# Altium footprint library sun_library.PcbLib: 412 footprints (part 6 of 26)
Each footprint in its own frame and in the unit in brackets; x right, y up, seen from the top. Pads: shape width x height; smd on the part's side, far side on the other; paste and mask are expansions set on the pad; w line width, h text height; cw(c..) or ccw(c..) is an arc to the next point about the centre after c.
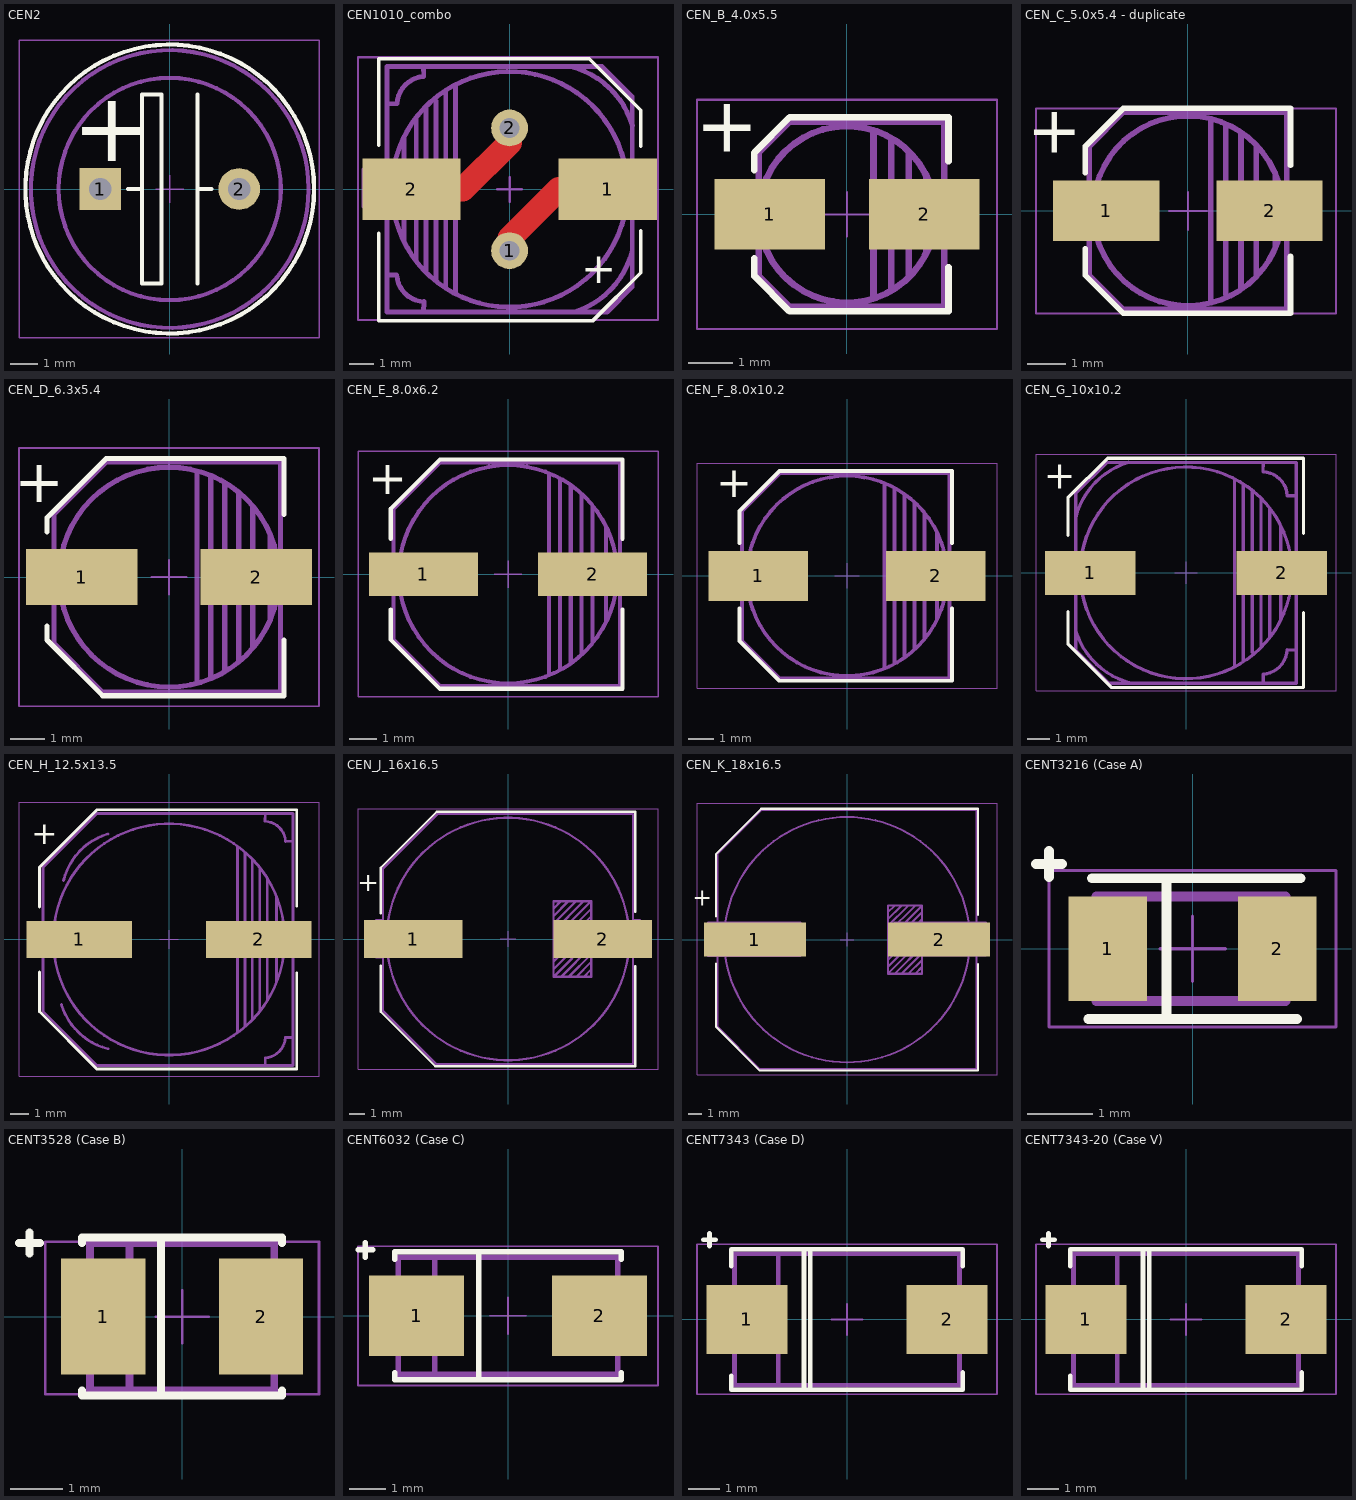
[diagram p5: the footprints below, top view; thin cyan lines are the x and y axes]

## CEN2 [mm]
pads (2):
  rect 1.5x1.5 hole 0.8: 1(-2.5,0)
  round 1.5 hole 0.8: 2(2.5,0)
Top Overlay:
  circle w0.15: c0,0 r5.2
  lines w0.15: -1.5,0 -1,0 ; 1,-3.4 1,3.4 ; 1,0 1.5,0 ; -1,-3.4 -0.3,-3.4 -0.3,3.4 -1,3.4 -1,-3.4
  text "+" at -3.5,1 h2.5
TopAssy 13:
  circle w0.15: c2.525,0.025 r0.613
  circle w0.15: c0,0 r5
  circle w0.15: c0,0 r4
  lines w0.15: -3.05,-0.65 -3.05,0.6 -1.9,0.6 -1.9,-0.65 -3.05,-0.65
  text "+" at -3.15,1.225 h1.34
CourtTop 15:
  lines w0.05: -0.5,0 0.5,0 ; 0,-0.5 0,0.5 ; -5.425,-5.35 5.375,-5.35 5.375,5.35 -5.425,5.35 -5.425,-5.35
3D body: height 20, standoff 1, extent 3.995,-1.161 5.207,1.56
3D body: height 21, standoff 0, extent -4.999,-4.999 4.999,4.999
3D body: height 21.1, standoff 21, extent -3.999,-3.999 3.999,3.999

## CEN1010_combo [mm]
height 2.1
pads (4):
  round 1.5 hole 0.8: 1(0,-2.5) 2(0,2.5)
  rect 4x2.5 smd: 1(4,0) 2(-4,0)
Top:
  lines w1: -4,0 -1.9,0 0,1.9 0,2.5 ; 0,-2.5 0,-2 2,0 4,0
Top Overlay:
  lines w0.15: -5.325,-1.8 -5.325,-5.35 3.4,-5.35 5.35,-3.4 5.35,-1.7 ; -5.325,1.8 -5.325,5.325 3.25,5.325 5.35,3.225 5.35,1.75
  text "+" at 2.925,-3.825 h1.25
TopAssy 13:
  circle w0.2: c0,0 r4.8
  lines w0.2: -5,-3.5 -4.594,-3.496 ccw(c-3.444,-3.429) -3.488,-4.58 -3.5,-5 ; -5,-0.7 -5.925,-0.7 -5.925,0.8 -5,0.8 ; -5,3.5 -4.58,3.488 cw(c-3.429,3.444) -3.496,4.594 -3.5,5 ; -4.3,-2.1 -4.3,2.1 ; -3.8,-2.9 -3.8,2.9 ; -3.4,-3.4 -3.4,3.3 ; -3,-3.7 -3,3.6 ; -2.6,-4 -2.6,4 ; -2.2,-4.2 -2.2,4.2 ; 2.497,4.996 cw(c1.653,1.6) 5.006,2.602 ; 2.605,-5.009 ccw(c1.603,-1.656) 5,-2.5 ; 5,-0.7 5.9,-0.7 5.9,0.8 5,0.8 ; -5,-5 3.975,-5 5,-3.975 5,3.775 3.775,5 -5,5 -5,-5
  text "+" at 1.35,-3.425 h2
CourtTop 15:
  lines w0.1: -0.5,0 0.5,0 ; 0,-0.5 0,0.5 ; -6.175,-5.325 6.05,-5.325 6.05,5.375 -6.175,5.375 -6.175,-5.325
3D body "User Library-cap_10x10x10-1.STEP": height 10.3, standoff -0.2, extent -5.899,-5.25 5.901,5.25

## CEN_B_4.0x5.5 [mm]
height 5.5
pads (2):
  rect 2.5x1.6 smd: 1(-1.75,0) 2(1.75,0)
Top Overlay:
  lines w0.15: -2.1,-1 -2.1,-1.4 -1.3,-2.2 2.3,-2.2 2.3,-1.2 ; -2.1,1 -2.1,1.4 -1.3,2.2 2.3,2.2 2.3,1.2
  text "+" at -2,2.5 h1.25
TopAssy 13:
  circle w0.15: c0,0 r2
  lines w0.15: -2,-0.4 -2.2,-0.4 -2.2,0.4 -2,0.4 ; 0.6,-1.9 0.6,1.9 ; 1,-1.7 1,1.7 ; 1.4,-1.4 1.4,1.4 ; 1.8,-0.8 1.8,0.9 ; 2.2,-0.4 2.4,-0.4 2.4,0.4 2.2,0.4 ; -2,-1.4 -2,1.4 -1.3,2.1 2.2,2.1 2.2,-2.1 -1.3,-2.1 -2,-1.4
  text "+" at -0.525,1.85 h0.96
CourtTop 15:
  lines w0.05: -0.5,0 0.5,0 ; 0,-0.5 0,0.5 ; -3.4,-2.6 -3.4,2.6 3.4,2.6 3.4,-2.6 -3.4,-2.6
3D body "User Library-CAPSMD4x3_9.STEP": height 3.91, standoff 0, extent -2.2,-2.15 2.4,2.15

## CEN_C_5.0x5.4 - duplicate [mm]
height 5.4
pads (2):
  rect 2.8x1.6 smd: 1(-2.15,0) 2(2.15,0)
Top Overlay:
  lines w0.15: -2.7,-1 -2.7,-1.7 -1.7,-2.7 2.7,-2.7 2.7,-1.2 ; -2.7,1 -2.7,1.7 -1.7,2.7 2.7,2.7 2.7,1.2
  text "+" at -2.8,2.6 h1.25
TopAssy 13:
  circle w0.15: c0,0 r2.5
  lines w0.15: -2.6,-0.4 -2.9,-0.4 -2.9,0.4 -2.6,0.4 ; 0.6,-2.4 0.6,2.4 ; 1,-2.2 1,2.2 ; 1.4,-2 1.4,2 ; 1.8,-1.7 1.8,1.7 ; 2.3,-0.9 2.3,1 ; 2.6,-0.4 2.9,-0.4 2.9,0.4 2.6,0.4 ; -2.6,-1.7 -1.7,-2.6 2.6,-2.6 2.6,2.6 -1.7,2.6 -2.6,1.7 -2.6,-1.7
  text "+" at -0.525,1.85 h0.96
CourtTop 15:
  lines w0.05: -0.5,0 0.5,0 ; 0,-0.5 0,0.5 ; -4,-2.7 -4,2.7 3.9,2.7 3.9,-2.7 -4,-2.7
3D body "User Library-ALU-C.STEP": height 5.41, standoff 0, extent -3,-2.65 2.9,2.65

## CEN_D_6.3x5.4 [mm]
height 5.4
pads (2):
  rect 3.2x1.6 smd: 1(-2.5,0) 2(2.5,0)
Top Overlay:
  lines w0.15: -3.5,-1.4 -3.5,-1.8 -1.9,-3.4 3.3,-3.4 3.3,-1.8 ; -3.5,1.3 -3.5,1.7 -1.8,3.4 3.3,3.4 3.3,1.8
  text "+" at -3,3.2 h1.25
TopAssy 13:
  circle w0.15: c0,0 r3.15
  lines w0.15: -3.2,-0.5 -3.5,-0.5 -3.5,0.5 -3.2,0.5 ; 0.8,-3 0.8,3 ; 1.2,-2.9 1.2,2.9 ; 1.6,-2.7 1.6,2.7 ; 2,-2.4 2,2.4 ; 2.4,-2 2.4,2 ; 2.9,-1.2 2.9,1.2 ; 3.2,-0.5 3.5,-0.5 3.5,0.5 3.2,0.5 ; -3.3,-1.9 -3.3,1.8 -1.8,3.3 3.2,3.3 3.2,-3.3 -1.9,-3.3 -3.3,-1.9
  text "+" at -1.1,2.125 h0.96
CourtTop 15:
  lines w0.05: -0.5,0 0.5,0 ; 0,-0.5 0,0.5 ; -4.3,-3.7 4.3,-3.7 4.3,3.7 -4.3,3.7 -4.3,-3.7
3D body "User Library-ALU-D.STEP": height 5.4, standoff 0, extent -3.5,-3.3 3.5,3.3

## CEN_E_8.0x6.2 [mm]
height 6.2
pads (2):
  rect 4x1.6 smd: 1(-3.1,0) 2(3.1,0)
Top Overlay:
  lines w0.15: -4.3,-1.3 -4.3,-2.4 -2.5,-4.2 4.2,-4.2 4.2,-1.3 ; -4.3,1.3 -4.3,2.4 -2.5,4.2 4.2,4.2 4.2,1.3
  text "+" at -3.7,4 h1.25
TopAssy 13:
  circle w0.15: c0,0 r4
  lines w0.15: -4.2,-0.4 -4.5,-0.4 -4.5,0.4 -4.2,0.4 ; 1.5,-3.7 1.5,3.7 ; 1.9,-3.5 1.9,3.5 ; 2.3,-3.2 2.3,3.2 ; 2.7,-2.9 2.7,2.9 ; 3.1,-2.5 3.1,2.5 ; 3.6,-1.7 3.6,1.7 ; 4.1,-0.5 4.4,-0.5 4.4,0.3 4.1,0.3 ; -4.2,-2.4 -2.5,-4.1 4.1,-4.1 4.1,4.1 -2.5,4.1 -4.2,2.4 -4.2,-2.4
  text "+" at -0.525,1.85 h0.96
CourtTop 15:
  lines w0.05: -0.5,0 0.5,0 ; 0,-0.5 0,0.5 ; -5.5,-4.5 -5.5,4.5 5.5,4.5 5.5,-4.5 -5.5,-4.5
3D body "User Library-ELEC_CAP_E_D8_L6_2.STEP": height 6.25, standoff 0.05, extent -4.55,-4.15 4.45,4.15

## CEN_F_8.0x10.2 [mm]
height 10.2
pads (2):
  rect 4x2 smd: 1(-3.55,0) 2(3.55,0)
Top Overlay:
  lines w0.15: -4.3,-1.3 -4.3,-2.6 -2.7,-4.2 4.2,-4.2 4.2,-1.3 ; -4.3,1.3 -4.3,2.6 -2.7,4.2 4.2,4.2 4.2,1.3
  text "+" at -3.8,4.2 h1.25
TopAssy 13:
  circle w0.15: c0,0 r4
  lines w0.15: -4.2,-0.4 -4.5,-0.4 -4.5,0.4 -4.2,0.4 ; 1.5,-3.7 1.5,3.7 ; 1.9,-3.5 1.9,3.5 ; 2.3,-3.2 2.3,3.2 ; 2.7,-2.9 2.7,2.9 ; 3.1,-2.5 3.1,2.5 ; 3.6,-1.7 3.6,1.7 ; 4.1,-0.5 4.4,-0.5 4.4,0.3 4.1,0.3 ; -4.2,-2.6 -4.2,2.6 -2.7,4.1 4.1,4.1 4.1,-4.1 -2.7,-4.1 -4.2,-2.6
  text "+" at -0.525,1.85 h0.96
CourtTop 15:
  lines w0.05: -0.5,0 0.5,0 ; 0,-0.5 0,0.5 ; -6,-4.5 6,-4.5 6,4.5 -6,4.5 -6,-4.5
3D body "User Library-capacitor size F10.step": height 11.23, standoff -0.2, extent -4.55,-4.15 4.45,4.15

## CEN_G_10x10.2 [mm]
height 10.2
pads (2):
  rect 4.1x2 smd: 1(-4.35,0) 2(4.35,0)
Top Overlay:
  lines w0.15: -5.35,-1.75 -5.35,-3.225 -3.375,-5.2 5.325,-5.2 5.325,-1.8 ; -5.35,1.7 -5.35,3.4 -3.55,5.2 5.325,5.2 5.325,1.8
  text "+" at -5,4.9 h1.25
TopAssy 13:
  circle w0.15: c0,0 r4.8
  lines w0.15: -5.006,-2.602 ccw(c-1.653,-1.6) -2.497,-4.996 ; -5,-0.8 -5.5,-0.8 -5.5,0.7 -5,0.7 ; -5,2.5 cw(c-1.603,1.656) -2.605,5.009 ; 2.2,-4.2 2.2,4.2 ; 2.6,-4 2.6,4 ; 3,-3.6 3,3.7 ; 3.4,-3.3 3.4,3.4 ; 3.5,-5 3.496,-4.594 ccw(c3.429,-3.444) 4.58,-3.488 5,-3.5 ; 3.5,5 3.488,4.58 cw(c3.444,3.429) 4.594,3.496 5,3.5 ; 3.8,-2.9 3.8,2.9 ; 4.3,-2.1 4.3,2.1 ; 5,-0.8 5.5,-0.8 5.5,0.7 5,0.7 ; -5,-3.5 -5,3.6 -3.6,5 5,5 5,-5 -3.5,-5 -5,-3.5
  text "+" at -1.35,3.425 h1.92
CourtTop 15:
  lines w0.05: -0.5,0 0.5,0 ; 0,-0.5 0,0.5 ; -6.8,-5.35 6.8,-5.35 6.8,5.375 -6.8,5.375 -6.8,-5.35
3D body "User Library-SMD Polymer Aluminum Electrolytic Capacitors F12 1500uF 2,5V.step": height 11.1, standoff -0.05, extent -5.5,-5.15 5.5,5.15

## CEN_H_12.5x13.5 [mm]
height 13.5
pads (2):
  rect 5.7x2 smd: 1(-4.85,0) 2(4.85,0)
Top Overlay:
  lines w0.15: -7,-1.75 -7,-3.9 -3.9,-7 6.9,-7 6.9,-1.8 ; -7,1.75 -7,3.9 -3.9,7 6.9,7 6.9,1.8
  text "+" at -6,6.2 h1.25
TopAssy 13:
  circle w0.15: c0,0 r6.25
  lines w0.15: -6.8,-0.7 -7.1,-0.7 -7.1,0.8 -6.8,0.8 ; -5.809,-3.505 ccw(c-2.456,-2.503) -3.3,-5.9 ; -5.695,3.191 cw(c-2.298,2.346) -3.3,5.7 ; 3.7,-5 3.7,5 ; 4.1,-4.7 4.1,4.7 ; 4.5,-4.3 4.5,4.3 ; 4.9,-3.8 4.9,3.8 ; 5.2,-6.8 5.196,-6.394 ccw(c5.129,-5.244) 6.28,-5.288 6.7,-5.3 ; 5.2,6.8 5.188,6.38 cw(c5.144,5.229) 6.294,5.296 6.7,5.3 ; 5.3,-3.3 5.3,3.3 ; 5.8,-2.3 5.8,2.3 ; 6.7,-0.7 7,-0.7 7,0.8 6.7,0.8 ; -6.8,-3.9 -6.8,3.9 -3.9,6.8 6.7,6.8 6.7,-6.8 -3.9,-6.8 -6.8,-3.9
  text "+" at -1.35,3.425 h1.92
CourtTop 15:
  lines w0.05: -0.5,0 0.5,0 ; 0,-0.5 0,0.5 ; -8.1,-7.4 8.1,-7.4 8.1,7.4 -8.1,7.4 -8.1,-7.4
3D body "User Library-capacitor size H13.step": height 13.5, standoff -0.01, extent -6.9,-6.75 6.9,6.75

## CEN_J_16x16.5 [mm]
height 16.5
pads (2):
  rect 6.5x2.5 smd: 1(-6.25,0) 2(6.25,0)
Top Overlay:
  lines w0.15: -8.4,-1.75 -8.4,-4.8 -4.8,-8.4 8.4,-8.4 8.4,-1.8 ; -8.4,1.7 -8.4,4.7 -4.7,8.4 8.4,8.4 8.4,1.8
  text "+" at -8.5,4.2 h1.25
TopAssy 13:
  circle w0.15: c0,0 r8
  lines w0.15: -8.25,-1.2 -8.7,-1.2 -8.7,1.25 -8.25,1.25 ; 3,-2 5.5,0.5 ; 3,-1.5 5.5,1 ; 3,-1 5.5,1.5 ; 3,-0.5 5.5,2 ; 3,0 5.5,2.5 ; 3,0.5 5,2.5 ; 3,1 4.5,2.5 ; 3,1.5 4,2.5 ; 3,2 3.5,2.5 ; 3.5,-2.5 5.5,-0.5 ; 4,-2.5 5.5,-1 ; 5,-2.5 5.5,-2 ; 5.5,-1.5 4.5,-2.5 ; 5.5,0 3,-2.5 ; 8.25,-1.175 8.7,-1.175 8.7,1.25 8.25,1.25 ; 3,-2.5 5.5,-2.5 5.5,2.5 ; 3,-2.5 3,2.5 5.5,2.5 ; 4,2.5 4,2.5 ; 4.5,-2.5 4.5,-2.5 ; 5.5,-0.5 5.5,-0.5 ; -8.25,-4.75 -8.25,4.65 -4.65,8.25 8.25,8.25 8.25,-8.25 -4.75,-8.25 -8.25,-4.75
  text "+" at -4,4.5 h1.92
CourtTop 15:
  lines w0.05: -0.5,0 0.5,0 ; 0,-0.5 0,0.5 ; -9.9,-8.6 -9.9,8.6 9.9,8.6 9.9,-8.6 -9.9,-8.6
3D body "User Library-E-CAP 1500UF_SUNCON (1).step": height 17, standoff -0.2, extent -8.65,-8.15 8.65,8.15

## CEN_K_18x16.5 [mm]
height 16.5
pads (2):
  rect 7.5x2.5 smd: 1(-6.75,0) 2(6.75,0)
Top Overlay:
  lines w0.15: -9.6,-1.75 -9.6,-6.4 -6.4,-9.6 9.6,-9.6 9.6,-1.8 ; -9.6,1.7 -9.6,6.3 -6.3,9.6 9.6,9.6 9.6,1.8
  text "+" at -9.9,3.6 h1.25
TopAssy 13:
  circle w0.15: c0,0 r9
  lines w0.15: 3,-2 5.5,0.5 ; 3,-1.5 5.5,1 ; 3,-1 5.5,1.5 ; 3,-0.5 5.5,2 ; 3,0 5.5,2.5 ; 3,0.5 5,2.5 ; 3,1 4.5,2.5 ; 3,1.5 4,2.5 ; 3,2 3.5,2.5 ; 3.5,-2.5 5.5,-0.5 ; 4,-2.5 5.5,-1 ; 5,-2.5 5.5,-2 ; 5.5,-1.5 4.5,-2.5 ; 5.5,0 3,-2.5 ; 3,-2.5 3,2.5 5.5,2.5 ; 3,-2.5 5.5,-2.5 5.5,2.5 ; 4,2.5 4,2.5 ; 4.5,-2.5 4.5,-2.5 ; 5.5,-0.5 5.5,-0.5 ; -10.2,-1.2 -3.4,-1.2 -3.4,1.25 -10.2,1.25 -10.2,-1.2 ; -9.5,-6.4 -6.4,-9.5 9.5,-9.5 9.5,9.5 -6.3,9.5 -9.5,6.3 -9.5,-6.4 ; 3.5,-1.175 3.5,1.25 10.2,1.25 10.2,-1.175 3.5,-1.175
  text "+" at -4,4.5 h1.92
CourtTop 15:
  lines w0.05: -0.5,0 0.5,0 ; 0,-0.5 0,0.5 ; -11,-9.9 11,-9.9 11,10 -11,10 -11,-9.9
3D body "User Library-TG_series_size_K16.step": height 16.5, standoff 0, extent -10.2,-9.5 10.2,9.5

## CENT3216 (Case A) [mm]
pads (2):
  rect 1.2x1.6 smd: 1(-1.3,0) 2(1.3,0)
Top Overlay:
  lines w0.15: -2.4,1.3 -2,1.3 ; -2.2,1.1 -2.2,1.5 ; -1.6,-1.075 1.6,-1.075 ; -1.54,1.083 1.66,1.083 ; -0.4,-1.075 -0.4,1.083
TopAssy 13:
  lines w0.15: -1.5,-0.6 -1.725,-0.6 -1.725,0.525 -1.5,0.525 ; -0.775,-0.8 -0.775,0.8 ; 1.425,-0.55 1.65,-0.55 1.65,0.575 1.425,0.575 ; -1.475,-0.8 1.425,-0.8 1.425,0.8 -1.475,0.8 -1.475,-0.8
  text "+" at -2.275,0.65 h0.96
CourtTop 15:
  lines w0.05: -0.5,0 0.5,0 ; 0,-0.5 0,0.5 ; -2.2,-1.2 2.2,-1.2 2.2,1.2 -2.2,1.2 -2.2,-1.2
3D body "User Library-CaseA_3216-18.step": height 1.6, standoff 0, extent -1.6,-0.805 1.6,0.795

## CENT3528 (Case B) [mm] "Capacitor, SM Tantalum; Body 3.5 x 2.8 mm (LxW typ)"
height 2.1
pads (2):
  rect 1.6x2.2 smd: 1(-1.5,0) 2(1.5,0)
Top Overlay:
  lines w0.15: -3.1,1.4 -2.7,1.4 ; -2.9,1.2 -2.9,1.6 ; -1.9,-1.4 -1.9,-1.5 1.9,-1.5 1.9,-1.4 ; -1.9,1.4 -1.9,1.5 1.9,1.5 1.9,1.4 ; -0.4,-1.4 -0.4,1.4
TopAssy 13:
  lines w0.15: -1.775,-0.75 -2,-0.75 -2,0.825 -1.775,0.825 ; -1,-1.4 -1,1.4 ; 1.75,-0.725 1.975,-0.725 1.975,0.85 1.75,0.85 ; -1.75,-1.4 -1.75,1.4 1.75,1.4 1.75,-1.4 -1.75,-1.4
  text "+" at -0.85,0.3 h0.96
CourtTop 15:
  lines w0.05: -0.5,0 0.5,0 ; 0,-0.5 0,0.5 ; -2.6,-1.475 -2.6,1.425 2.6,1.425 2.6,-1.475 -2.6,-1.475
3D body "User Library-CaseB_3528-21.step": height 1.9, standoff 0, extent -1.75,-1.401 1.75,1.399

## CENT6032 (Case C) [mm] "Capacitor, SM Tantalum; Body 6.0 x 3.2 mm (LxW typ)"
height 2.8
pads (2):
  rect 2.6x2.2 smd: 1(-2.5,0) 2(2.5,0)
Top Overlay:
  lines w0.15: -4.1,1.8 -3.7,1.8 ; -3.9,1.6 -3.9,2 ; -3.1,-1.55 -3.1,-1.75 3.1,-1.75 3.1,-1.55 ; -3.1,1.55 -3.1,1.75 3.1,1.75 3.1,1.55 ; -0.8,-1.75 -0.8,1.75
TopAssy 13:
  lines w0.15: -3,-0.775 -3.225,-0.775 -3.225,0.8 -3,0.8 ; -2,-1.6 -2,1.6 ; 3,-0.725 3.225,-0.725 3.225,0.85 3,0.85 ; -3,-1.6 3,-1.6 3,1.6 -3,1.6 -3,-1.6
  text "+" at -1.775,0.575 h0.96
CourtTop 15:
  lines w0.05: -0.5,0 0.5,0 ; 0,-0.5 0,0.5 ; -4.1,-1.9 -4.1,1.9 4.1,1.9 4.1,-1.9 -4.1,-1.9
3D body "User Library-CaseC_6032-28.step": height 2.5, standoff 0, extent -3,-1.602 3,1.598

## CENT7343 (Case D) [mm] "Capacitor, SM Tantalum; Body 7.3 x 4.3 mm (LxW typ)"
height 2.8
pads (2):
  rect 2.6x2.2 smd: 1(-3.2,0) 2(3.2,0)
Top Overlay:
  lines w0.15: -4.6,2.55 -4.2,2.55 ; -4.4,2.35 -4.4,2.75 ; -3.7,-1.8 -3.7,-2.25 3.7,-2.25 3.7,-1.7 ; -3.7,1.7 -3.7,2.25 3.7,2.25 3.7,1.7 ; -1.375,-2.25 -1.375,2.25 ; -1.175,-2.25 -1.175,2.25
TopAssy 13:
  lines w0.15: -3.6,-0.8 -3.825,-0.8 -3.825,0.775 -3.6,0.775 ; -2.2,-2.1 -2.2,2.1 ; 3.6,-0.775 3.825,-0.775 3.825,0.8 3.6,0.8 ; -3.6,-2.1 3.6,-2.1 3.6,2.1 -3.6,2.1 -3.6,-2.1
  text "+" at -1.825,0.65 h0.96
CourtTop 15:
  lines w0.05: -0.5,0 0.5,0 ; 0,-0.5 0,0.5 ; -4.8,-2.4 4.8,-2.4 4.8,2.4 -4.8,2.4 -4.8,-2.4
3D body "User Library-CaseD_7343-31.step": height 2.8, standoff 0, extent -3.65,-2.15 3.65,2.15

## CENT7343-20 (Case V) [mm] "Capacitor, SM Tantalum; Body 7.3 x 4.3 mm (LxW typ)"
height 2
pads (2):
  rect 2.6x2.2 smd: 1(-3.2,0) 2(3.2,0)
Top Overlay:
  lines w0.15: -4.6,2.55 -4.2,2.55 ; -4.4,2.35 -4.4,2.75 ; -3.7,-1.8 -3.7,-2.25 3.7,-2.25 3.7,-1.7 ; -3.7,1.7 -3.7,2.25 3.7,2.25 3.7,1.7 ; -1.375,-2.25 -1.375,2.25 ; -1.175,-2.25 -1.175,2.25
TopAssy 13:
  lines w0.15: -3.6,-0.8 -3.825,-0.8 -3.825,0.775 -3.6,0.775 ; -2.2,-2.1 -2.2,2.1 ; 3.6,-0.775 3.825,-0.775 3.825,0.8 3.6,0.8 ; -3.6,-2.1 -3.6,2.1 3.6,2.1 3.6,-2.1 -3.6,-2.1
  text "+" at -1.975,0.6 h0.96
CourtTop 15:
  lines w0.05: -0.5,0 0.5,0 ; 0,-0.5 0,0.5 ; -4.8,-2.4 4.8,-2.4 4.8,2.4 -4.8,2.4 -4.8,-2.4
3D body "User Library-CaseV_7343-20.step": height 2, standoff 0, extent -3.65,-2.15 3.65,2.15